# Altium footprint library AD_Lib.PcbLib: 508 footprints (part 31 of 32)
Each footprint in its own frame and in the unit in brackets; x right, y up, seen from the top. Pads: shape width x height; smd on the part's side, far side on the other; paste and mask are expansions set on the pad; w line width, h text height; cw(c..) or ccw(c..) is an arc to the next point about the centre after c.
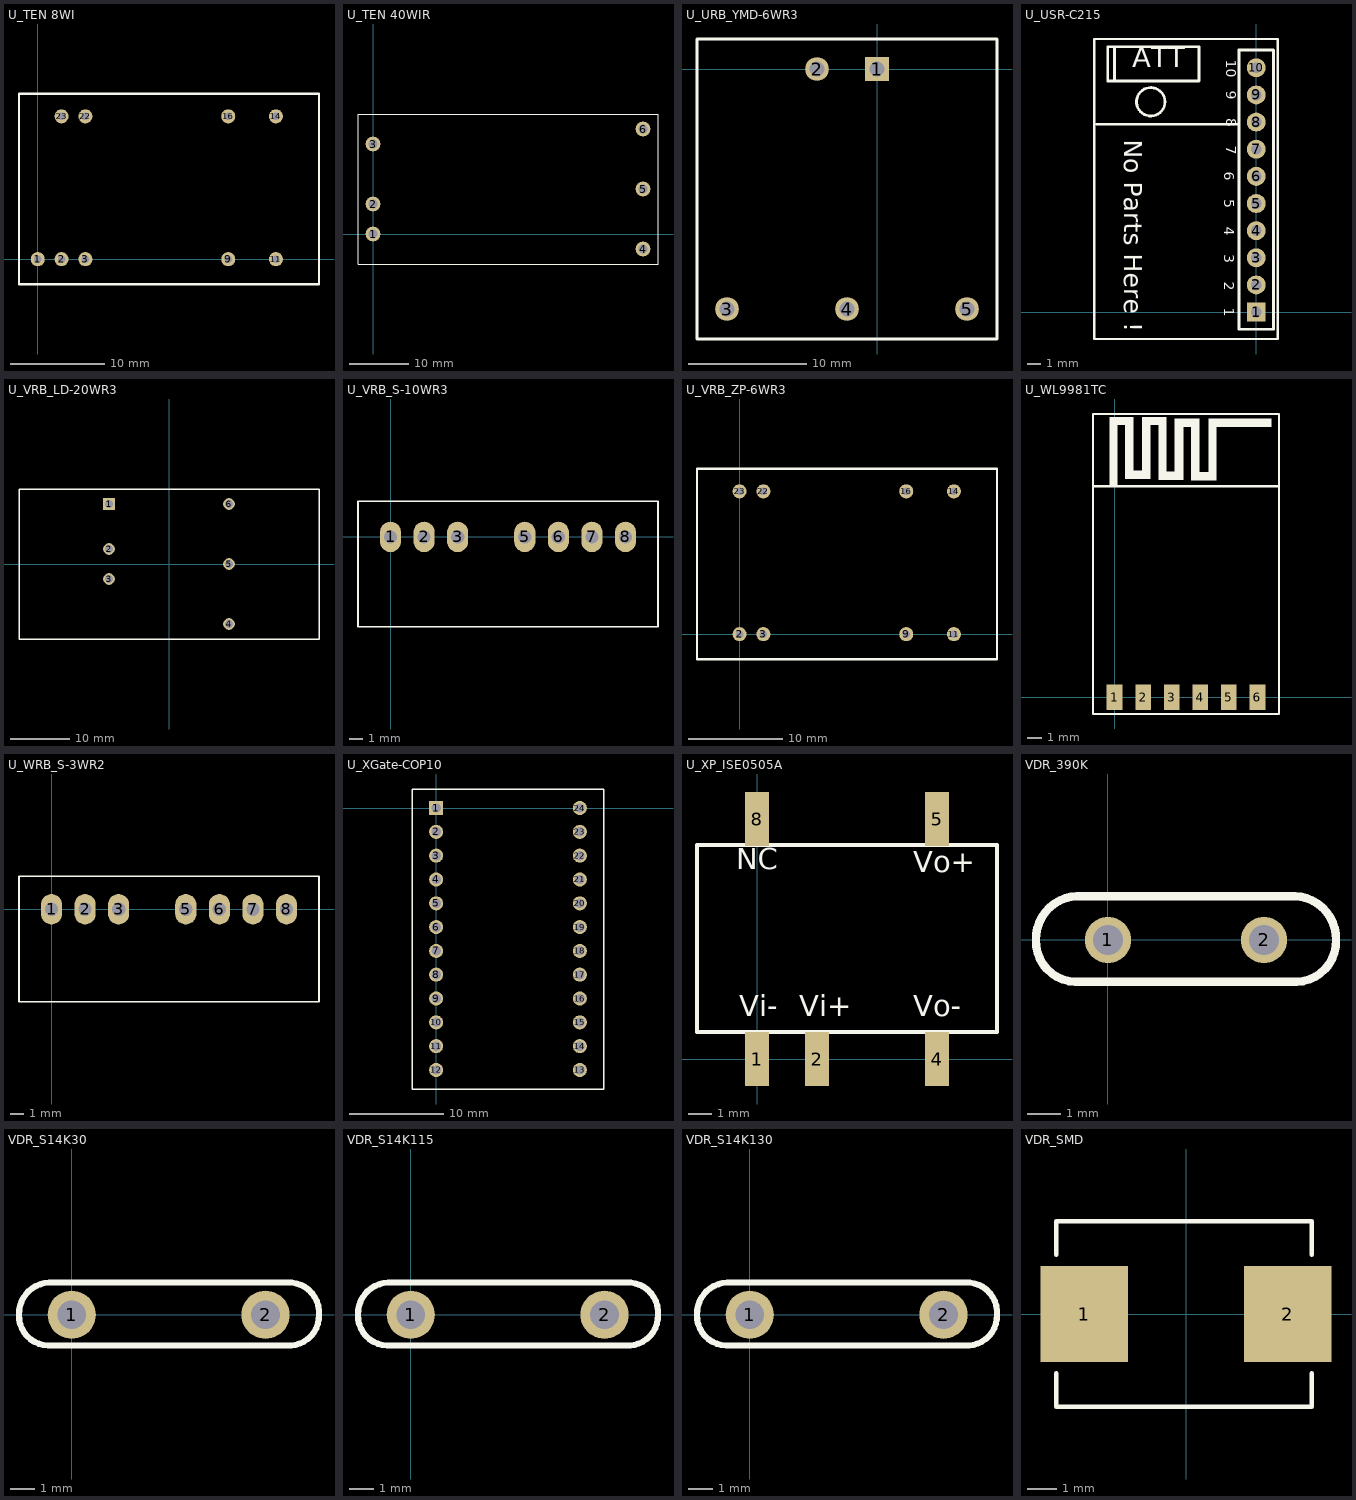
[diagram p30: the footprints below, top view; thin cyan lines are the x and y axes]

## U_TEN 8WI [mm] "DC/DC，TEN 8WI系列；TRACO"
height 10.2
pads (9):
  round 1.5 hole 0.8: 1(0,0) 2(2.54,0) 3(5.08,0) 9(20.32,0) 11(25.4,0) 14(25.4,15.24) 16(20.32,15.24) 22(5.08,15.24) 23(2.54,15.24)
Top Overlay:
  lines w0.254: -2,-2.66 30,-2.66 30,17.64 -2,17.64 -2,-2.66
Bottom Overlay:
  text "Vout+" at 25.811,13.973 h1.52
  text "Vout-" at 20.731,13.973 h1.52
  text "Vin+" at 5.491,13.973 h1.52
  text "Vin+" at 2.951,13.973 h1.52
  text "NC" at 20.858,3.045 h1.52
  text "NC" at 25.938,3.045 h1.52
  text "Vin-" at 5.618,3.045 h1.52
  text "Vin-" at 3.078,3.045 h1.52
  text "ON/OFF" at 0.635,5.207 h1.52

## U_TEN 40WIR [mm] "TRACO电源模块，110V-->24V"
height 10.2
pads (6):
  round 2.5 hole 1.5: 1(0,0) 2(0,5.08) 3(0,15.24) 4(45.72,-2.54) 5(45.72,7.62) 6(45.72,17.78)
Top Overlay:
  lines w0.2: -2.54,-5.08 -2.54,20.32 48.26,20.32 48.26,-5.08 -2.54,-5.08
Bottom Overlay:
  text "ON/OFF" at 9.144,14.478 h2.54
  text "Vin-" at 6.35,4.318 h2.54
  text "Vin+" at 6.35,-0.762 h2.54
  text "Vout+" at 42.418,-3.302 h2.54
  text "Vout-" at 42.418,6.858 h2.54
  text "trim" at 42.672,17.018 h2.54

## U_URB_YMD-6WR3 [mm] "金升阳URB_YMD-6WR3系列"
height 11.7
pads (5):
  rect 2x2 hole 1.3: 1(0,0)
  round 2 hole 1.3: 2(-5.08,0) 3(-12.7,-20.32) 4(-2.54,-20.32) 5(7.62,-20.32)
Top Overlay:
  lines w0.254: -15.24,-22.86 -15.24,2.54 10.16,2.54 10.16,-22.86 -15.24,-22.86
Bottom Overlay:
  text "0V" at 6.858,-18.415 h2.54
  text "NC" at -3.302,-18.415 h2.54
  text "+Vo" at -13.462,-18.415 h2.54
  text "Vin" at -5.842,-4.064 h2.54
  text "GND" at -0.762,-5.334 h2.54

## U_USR-C215 [mil] "山东有人串口转WiFi模块"
height 362.2
pads (10):
  rect 55x55 hole 31.5: 1(0,0)
  round 55 hole 31.5: 2(0,78.74) 3(0,157.48) 4(0,236.22) 5(0,314.96) 6(0,393.7) 7(0,472.44) 8(0,551.18) 9(0,629.92) 10(0,708.66)
Top Overlay:
  circle w7.87: c-306,610 r41.23
  lines w7: -469.5,-78 62,-78 62,792.14 -469.5,792.14 -469.5,-78
  lines w8: -462.31,545 -51,545 -51,760 ; -416,770 -411,770 -411,670 ; -431,670 -431,770 -166,770 -166,670 -431,670 ; -50,-50 50,-50 50,760 -50,760 -50,-50
  text "1" at -102.44,12.4 h50
  text "9" at -97.44,642.4 h50
  text "10" at -97.44,732.4 h50
  text "6" at -102.44,407.4 h50
  text "5" at -102.44,327.4 h50
  text "4" at -102.44,247.4 h50
  text "3" at -102.44,167.4 h50
  text "2" at -102.44,87.4 h50
  text "7" at -97.44,482.4 h50
  text "8" at -97.44,562.4 h50
  text "ATT" at -360,690 h100
  text "No Parts Here !" at -400,500 h90
Bottom Overlay:
  lines w7: -469.5,-78 62,-78 62,792.14 -469.5,792.14 -469.5,-78
  text "No Parts Here !" at -340,500 h90
  text "1" at -102.44,-2.6 h50
  text "9" at -97.44,627.4 h50
  text "10" at -97.44,697.4 h50
  text "6" at -102.44,392.4 h50
  text "5" at -102.44,312.4 h50
  text "4" at -102.44,232.4 h50
  text "3" at -102.44,152.4 h50
  text "2" at -102.44,72.4 h50
  text "7" at -97.44,467.4 h50
  text "8" at -97.44,547.4 h50

## U_VRB_LD-20WR3 [mm] "金升阳VRB_LD-20WR3系列"
height 11.8
pads (6):
  rect 2x2 hole 1.3: 1(-10.16,10.16)
  round 2 hole 1.3: 2(-10.16,2.54) 3(-10.16,-2.54) 4(10.16,-10.16) 5(10.16,0) 6(10.16,10.16)
Top Overlay:
  lines w0.254: -25.4,-12.7 -25.4,12.7 25.4,12.7 25.4,-12.7 -25.4,-12.7
Bottom Overlay:
  text "Ctrl" at -12.065,9.398 h2.54
  text "GND" at -12.065,1.778 h2.54
  text "Vin" at -12.065,-3.302 h2.54
  text "+Vo" at 8.255,-10.922 h2.54
  text "Trim" at 8.255,-0.762 h2.54
  text "0V" at 8.255,9.398 h2.54

## U_VRB_S-10WR3 [mm] "DC/DC，VMORNSUN之RB_S-10WR3系列；"
height 12
pads (7):
  oval 1.6x2.3 hole 1: 1(0,0) 2(2.54,0) 3(5.08,0) 5(10.16,0) 6(12.7,0) 7(15.24,0) 8(17.78,0)
Top Overlay:
  lines w0.127: -2.46,-6.8 20.24,-6.8 20.24,2.7 -2.46,2.7 -2.46,-6.8
Bottom Overlay:
  text "VRB_S-10WR3" at 11.684,1.524 h0.76
  text "NC" at 18.288,-2.54 h0.76
  text "0V" at 15.748,-2.54 h0.76
  text "+Vo" at 13.589,-2.54 h0.76
  text "NC" at 10.668,-2.54 h0.76
  text "Ctrl" at 5.842,-2.54 h0.76
  text "Vin" at 3.175,-2.54 h0.76
  text "GND" at 0.889,-2.54 h0.76

## U_VRB_ZP-6WR3 [mm] "DC/DC，VRB_ZP-6WR3系列；MORNSUN"
height 10.8
pads (8):
  round 1.5 hole 0.8: 2(0,0) 3(2.54,0) 9(17.78,0) 11(22.86,0) 14(22.86,15.24) 16(17.78,15.24) 22(2.54,15.24) 23(0,15.24)
Top Overlay:
  lines w0.254: -4.54,-2.66 27.46,-2.66 27.46,17.64 -4.54,17.64 -4.54,-2.66
Bottom Overlay:
  text "NC" at 18.318,3.045 h1.52
  text "Vout+" at 23.271,13.973 h1.52
  text "Vout-" at 18.191,13.973 h1.52
  text "Vin+" at 2.951,13.973 h1.52
  text "Vin+" at 0.411,13.973 h1.52
  text "NC" at 23.398,3.045 h1.52
  text "Vin-" at 3.078,3.045 h1.52
  text "Vin-" at 0.538,3.045 h1.52

## U_WL9981TC [mm] "七艾蓝牙透传模块"
height 5
pads (6):
  rect 1.1x1.8 smd: 1(0,0) 2(2,0) 3(4,0) 4(6,0) 5(8,0) 6(10,0)
Top Overlay:
  rectangle: 7.152,18.923 10.987,19.533
  rectangle: 6.568,15.773 7.152,19.533
  rectangle: 5.958,15.164 7.152,15.773
  rectangle: 5.348,15.164 5.958,18.923
  rectangle: 4.84,18.923 5.958,19.533
  rectangle: 4.205,15.799 4.84,19.533
  rectangle: 3.647,15.215 4.84,15.799
  rectangle: 3.062,15.215 3.647,19.05
  rectangle: 2.529,19.05 3.647,19.634
  rectangle: 1.919,15.875 2.529,19.634
  rectangle: 1.335,15.291 2.529,15.875
  rectangle: 0.726,15.291 1.335,19.05
  rectangle: 0.218,19.05 1.335,19.634
  rectangle: -0.367,14.783 0.218,19.634
  lines w0.152: -1.5,14.783 11.5,14.783 ; -1.5,-1.165 11.5,-1.165 11.5,19.835 -1.5,19.835 -1.5,-1.165

## U_WRB_S-3WR2 [mm] "DC/DC，VMORNSUN之WRB_S-3WR2系列；"
height 12
pads (7):
  oval 1.6x2.3 hole 1: 1(0,0) 2(2.54,0) 3(5.08,0) 5(10.16,0) 6(12.7,0) 7(15.24,0) 8(17.78,0)
Top Overlay:
  lines w0.127: -2.46,-7 20.24,-7 20.24,2.5 -2.46,2.5 -2.46,-7
Bottom Overlay:
  text "WRB_S-3WR2" at 11.684,1.524 h0.76
  text "CS" at 18.288,-2.54 h0.76
  text "0V" at 15.748,-2.54 h0.76
  text "+Vo" at 13.589,-2.54 h0.76
  text "NC" at 10.668,-2.54 h0.76
  text "Ctrl" at 5.842,-2.54 h0.76
  text "Vin" at 3.175,-2.54 h0.76
  text "GND" at 0.889,-2.54 h0.76

## U_XGate-COP10 [mm] "广州致远之XGate模块，CANopen协议转换模块"
height 11
pads (24):
  rect 1.5x1.5 hole 1: 1(0,0)
  round 1.5 hole 1: 2(0,-2.54) 3(0,-5.08) 4(0,-7.62) 5(0,-10.16) 6(0,-12.7) 7(0,-15.24) 8(0,-17.78) 9(0,-20.32) 10(0,-22.86) 11(0,-25.4) 12(0,-27.94) 13(15.32,-27.94) 14(15.32,-25.4) 15(15.32,-22.86) 16(15.32,-20.32) 17(15.32,-17.78) 18(15.32,-15.24) 19(15.32,-12.7) 20(15.32,-10.16) 21(15.32,-7.62) 22(15.32,-5.08) 23(15.32,-2.54) 24(15.32,0)
Top Overlay:
  lines w0.152: -2.54,-29.97 -2.54,2.03 17.86,2.03 17.86,-29.97 -2.54,-29.97

## U_XP_ISE0505A [mm] "DC/DC XP"
height 7.25
pads (5):
  rect 1x2.29 smd: 1(0,0) 2(2.54,0) 4(7.62,0) 5(7.62,10.16) 8(0,10.16)
Top Overlay:
  lines w0.178: -2.54,1.143 10.16,1.143 10.16,9.057 -2.54,9.057 -2.54,1.143
  text "NC" at -0.889,7.747 h1.52
  text "Vo+" at 6.604,7.62 h1.52
  text "Vo-" at 6.604,1.524 h1.52
  text "Vi+" at 1.778,1.524 h1.52
  text "Vi-" at -0.762,1.524 h1.52

## VDR_390K [mm] "台湾君耀之390K系列压敏电阻，如390KD07"
height 10
pads (2):
  round 1.4 hole 0.9: 1(0,0) 2(4.737,0)
Top Overlay:
  lines w0.254: -0.991,-1.27 cw(c-0.953,-0.038) -2.184,0 cw(c-0.897,0.043) -0.94,1.33 ; -0.94,-1.27 5.728,-1.27 ccw(c5.69,-0.038) 6.921,0 ccw(c5.634,0.043) 5.677,1.33 -0.889,1.33

## VDR_S14K30 [mm] "EPCOS，直插压敏电阻"
height 20
pads (2):
  round 2 hole 1.2: 1(0,0) 2(8.026,0)
Top Overlay:
  lines w0.254: -0.991,-1.27 cw(c-0.953,-0.038) -2.184,0 cw(c-0.897,0.043) -0.94,1.33 ; -0.94,-1.27 2.108,-1.27 ; -0.889,1.33 6.096,1.33 ; 1.81,-1.27 8.966,-1.27 9.093,-1.27 ; 5.918,1.33 8.779,1.33 9.033,1.33 ; 9.068,-1.27 ccw(c9.017,-0.051) 10.236,0 ccw(c9.008,0.102) 9.109,1.33

## VDR_S14K115 [mm] "EPCOS，直插压敏电阻"
height 20
pads (2):
  round 2 hole 1.2: 1(0,0) 2(8.026,0)
Top Overlay:
  lines w0.254: -0.991,-1.27 cw(c-0.953,-0.038) -2.184,0 cw(c-0.897,0.043) -0.94,1.33 ; -0.94,-1.27 2.108,-1.27 ; -0.889,1.33 6.096,1.33 ; 1.81,-1.27 8.966,-1.27 9.093,-1.27 ; 5.918,1.33 8.779,1.33 9.033,1.33 ; 9.068,-1.27 ccw(c9.017,-0.051) 10.236,0 ccw(c9.008,0.102) 9.109,1.33

## VDR_S14K130 [mm] "EPCOS，直插压敏电阻"
height 20
pads (2):
  round 2 hole 1.2: 1(0,0) 2(8.026,0)
Top Overlay:
  lines w0.254: -0.991,-1.27 cw(c-0.953,-0.038) -2.184,0 cw(c-0.897,0.043) -0.94,1.33 ; -0.94,-1.27 2.108,-1.27 ; -0.889,1.33 6.096,1.33 ; 1.81,-1.27 8.966,-1.27 9.093,-1.27 ; 5.918,1.33 8.779,1.33 9.033,1.33 ; 9.068,-1.27 ccw(c9.017,-0.051) 10.236,0 ccw(c9.008,0.102) 9.109,1.33

## VDR_SMD [mm] "贴片压敏电阻"
height 3.5
pads (2):
  rect 3x3.3 smd: 1(-3.492,0) 2(3.492,0)
Top Overlay:
  lines w0.152: -4.445,-2.032 -4.445,-3.175 4.318,-3.175 4.318,-2.032 ; -4.445,2.032 -4.445,3.175 4.318,3.175 4.318,2.032